# Altium footprint library cool_library.PcbLib: 1182 footprints (part 1 of 75)
Each footprint in its own frame and in the unit in brackets; x right, y up, seen from the top. Pads: shape width x height; smd on the part's side, far side on the other; paste and mask are expansions set on the pad; w line width, h text height; cw(c..) or ccw(c..) is an arc to the next point about the centre after c.
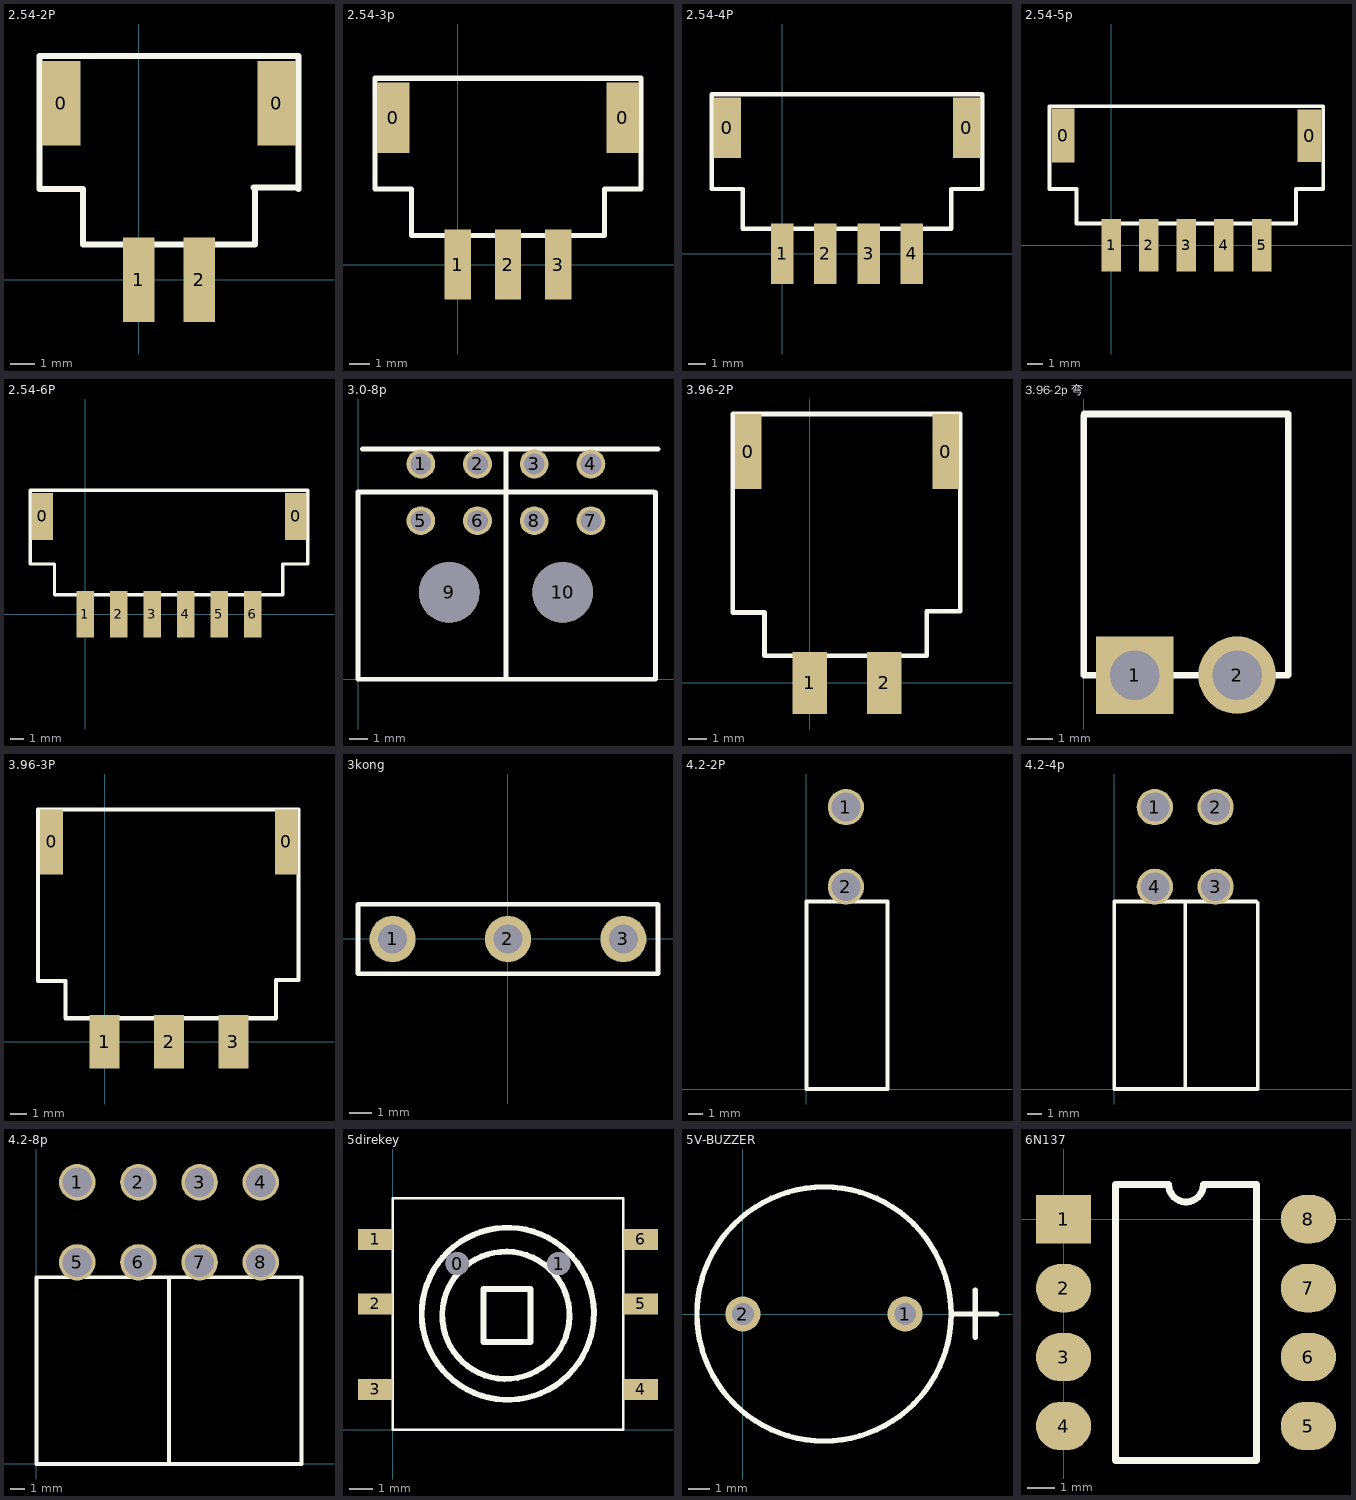
[diagram p0: the footprints below, top view; thin cyan lines are the x and y axes]

## 2.54-2P [mm]
pads (4):
  rect 1.6x3.5 smd: 0(-3.2,7.3) 0(5.7,7.3)
  rect 1.3x3.5 smd: 1(0,0) 2(2.5,0)
Top Overlay:
  lines w0.254: 4.746,3.81 5.196,3.81 6.096,3.81 6.546,3.81 ; 4.8,3.75 4.8,1.45 -2.3,1.45 -2.3,3.75 -4.1,3.75 -4.1,9.25 6.6,9.25 6.6,3.75

## 2.54-3p [mm]
pads (5):
  rect 1.6x3.5 smd: 0(-3.2,7.3) 0(8.2,7.3)
  rect 1.3x3.5 smd: 1(0,0) 2(2.5,0) 3(5,0)
Top Overlay:
  lines w0.254: -4.1,3.75 -2.3,3.75 -2.3,1.45 7.3,1.45 7.3,3.75 9.1,3.75 9.1,9.25 -4.1,9.25 -4.1,3.75

## 2.54-4P [mm]
pads (6):
  rect 1.6x3.5 smd: 0(-3.2,7.3) 0(10.7,7.3)
  rect 1.3x3.5 smd: 1(0,0) 2(2.5,0) 3(5,0) 4(7.5,0)
Top Overlay:
  lines w0.254: -4.1,3.75 -4.1,9.25 11.6,9.25 11.6,3.75 9.8,3.75 9.8,1.45 -2.3,1.45 -2.3,3.75 -4.1,3.75

## 2.54-5p [mm]
pads (7):
  rect 1.5x3.6 smd: 0(-3.2,7.3)
  rect 1.6x3.5 smd: 0(13.2,7.3)
  rect 1.3x3.5 smd: 1(0,0) 2(2.5,0) 3(5,0) 4(7.5,0) 5(10,0)
Top Overlay:
  lines w0.254: -4.1,3.75 -2.3,3.75 -2.3,1.45 12.3,1.45 12.3,3.75 14.1,3.75 14.1,9.25 -4.1,9.25 -4.1,3.75

## 2.54-6P [mm]
pads (8):
  rect 1.6x3.5 smd: 0(-3.2,7.3) 0(15.7,7.3)
  rect 1.3x3.5 smd: 1(0,0) 2(2.5,0) 3(5,0) 4(7.5,0) 5(10,0) 6(12.5,0)
Top Overlay:
  lines w0.254: 14.732,3.75 14.732,1.45 -2.3,1.45 -2.3,3.75 -4.1,3.75 -4.1,9.25 16.6,9.25 16.6,3.75 14.8,3.75

## 3.0-8p [mm]
pads (10):
  round 1.524 hole 1.1: 1(3.325,11.392) 2(6.325,11.392) 3(9.325,11.392) 4(12.325,11.392) 5(3.325,8.392) 6(6.325,8.392) 7(12.325,8.392) 8(9.325,8.392)
  round 3.2 hole 3.2: 9(4.825,4.6) 10(10.825,4.6)
Top Overlay:
  lines w0.254: 0,9.9 0,0 15.65,0 ; 0,9.906 15.65,9.906 ; 0.225,12.192 15.875,12.192 ; 7.825,0 7.825,12.2 ; 15.748,0 15.748,9.9

## 3.96-2P [mm]
pads (4):
  rect 1.4x4 smd: 0(-3.27,12.3) 0(7.23,12.3)
  rect 1.84x3.3 smd: 1(0,0) 2(3.96,0)
Top Overlay:
  lines w0.254: -4.1,3.75 -2.413,3.75 -2.413,1.45 6.223,1.45 6.223,3.81 8.001,3.81 8.001,14.3 -4.1,14.3 -4.1,3.75

## 3.96-2p 弯 [mm]
pads (2):
  rect 3x3 hole 1.9: 1(1.98,2.921)
  round 3 hole 1.9: 2(5.94,2.921)
Top Overlay:
  lines w0.254: 0,12.954 0,2.921 7.92,2.921 7.92,13.021 0.032,13.021 ; 0.032,2.921 2.032,2.921

## 3.96-3P [mm]
pads (5):
  rect 1.4x4 smd: 0(-3.27,12.3) 0(11.19,12.3)
  rect 1.84x3.3 smd: 1(0,0) 2(3.96,0) 3(7.92,0)
Top Overlay:
  lines w0.254: -4.1,3.75 -2.413,3.75 -2.413,1.45 10.541,1.45 10.541,3.81 11.938,3.81 11.938,14.3 -4.1,14.3 -4.1,3.75

## 3kong [mil]
pads (3):
  round 80 hole 50: 1(-200,0) 2(0,0) 3(200,0)
Top Overlay:
  lines w8: -260,-60 -260,60 260,60 260,-60 -260,-60

## 4.2-2P [mm]
pads (2):
  round 2.5 hole 2: 1(2.726,19.47) 2(2.726,13.97)
Top Overlay:
  lines w0.254: 0,0 5.6,0 5.6,12.954 0,12.954 0,0

## 4.2-4p [mm] "4.2端子"
pads (4):
  round 2.5 hole 2: 1(2.8,19.47) 2(7,19.47) 3(7,13.97) 4(2.8,13.97)
Top Overlay:
  lines w0.254: 0,12.85 0,0 9.8,0 ; 0,12.954 9.8,12.954 ; 4.9,0 4.9,12.954 ; 9.906,0 9.906,12.85

## 4.2-8p [mm]
pads (8):
  round 2.5 hole 2: 1(2.8,19.343) 2(7,19.343) 3(11.2,19.343) 4(15.4,19.343) 5(2.8,13.843) 6(7,13.843) 7(11.2,13.843) 8(15.4,13.843)
Top Overlay:
  lines w0.254: 0,12.723 0,0 18.2,0 18.2,12.723 ; 0,12.827 18.2,12.827 ; 9.1,0 9.1,12.827

## 5direkey [mm]
pads (8):
  round 1 hole 1: 0(2.8,7.2) 1(7.2,7.2)
  rect 1.5x0.9 smd: 1(-0.75,8.25) 2(-0.75,5.45) 3(-0.75,1.75) 4(10.75,1.75) 5(10.75,5.45) 6(10.75,8.25)
Top Overlay:
  lines w0.1: 0,10 0,0 10,0 10,10 ; 0,10.033 10,10.033
  lines w0.254: 7.098,3.284 cw(c4.909,4.961) 7.112,3.302 ; 7.553,2.316 cw(c4.991,5.028) 7.62,2.38 ; 3.937,3.81 3.937,6.096 5.969,6.096 5.969,3.81 3.937,3.81

## 5V-BUZZER [mil]
pads (2):
  round 65 hole 40: 1(300,0) 2(0,0)
Top Overlay:
  circle w10: c150,0 r235
  lines w10: 385,0 470,0 ; 430,-43 430,44

## 6N137 [mil]
pads (8):
  rect 80x70 smd: 1(0,0)
  oval 80x70 smd: 2(0,-100) 3(0,-200) 4(0,-300) 5(355,-300) 6(355,-200) 7(355,-100) 8(355,0)
Top Overlay:
  lines w10: 75,-350 75,50 152.5,50 ccw(c177.5,50) 202.5,50 280,50 280,-350 75,-350